# Altium footprint library General.PcbLib: 246 footprints (part 1 of 16)
Each footprint in its own frame and in the unit in brackets; x right, y up, seen from the top. Pads: shape width x height; smd on the part's side, far side on the other; paste and mask are expansions set on the pad; w line width, h text height; cw(c..) or ccw(c..) is an arc to the next point about the centre after c.
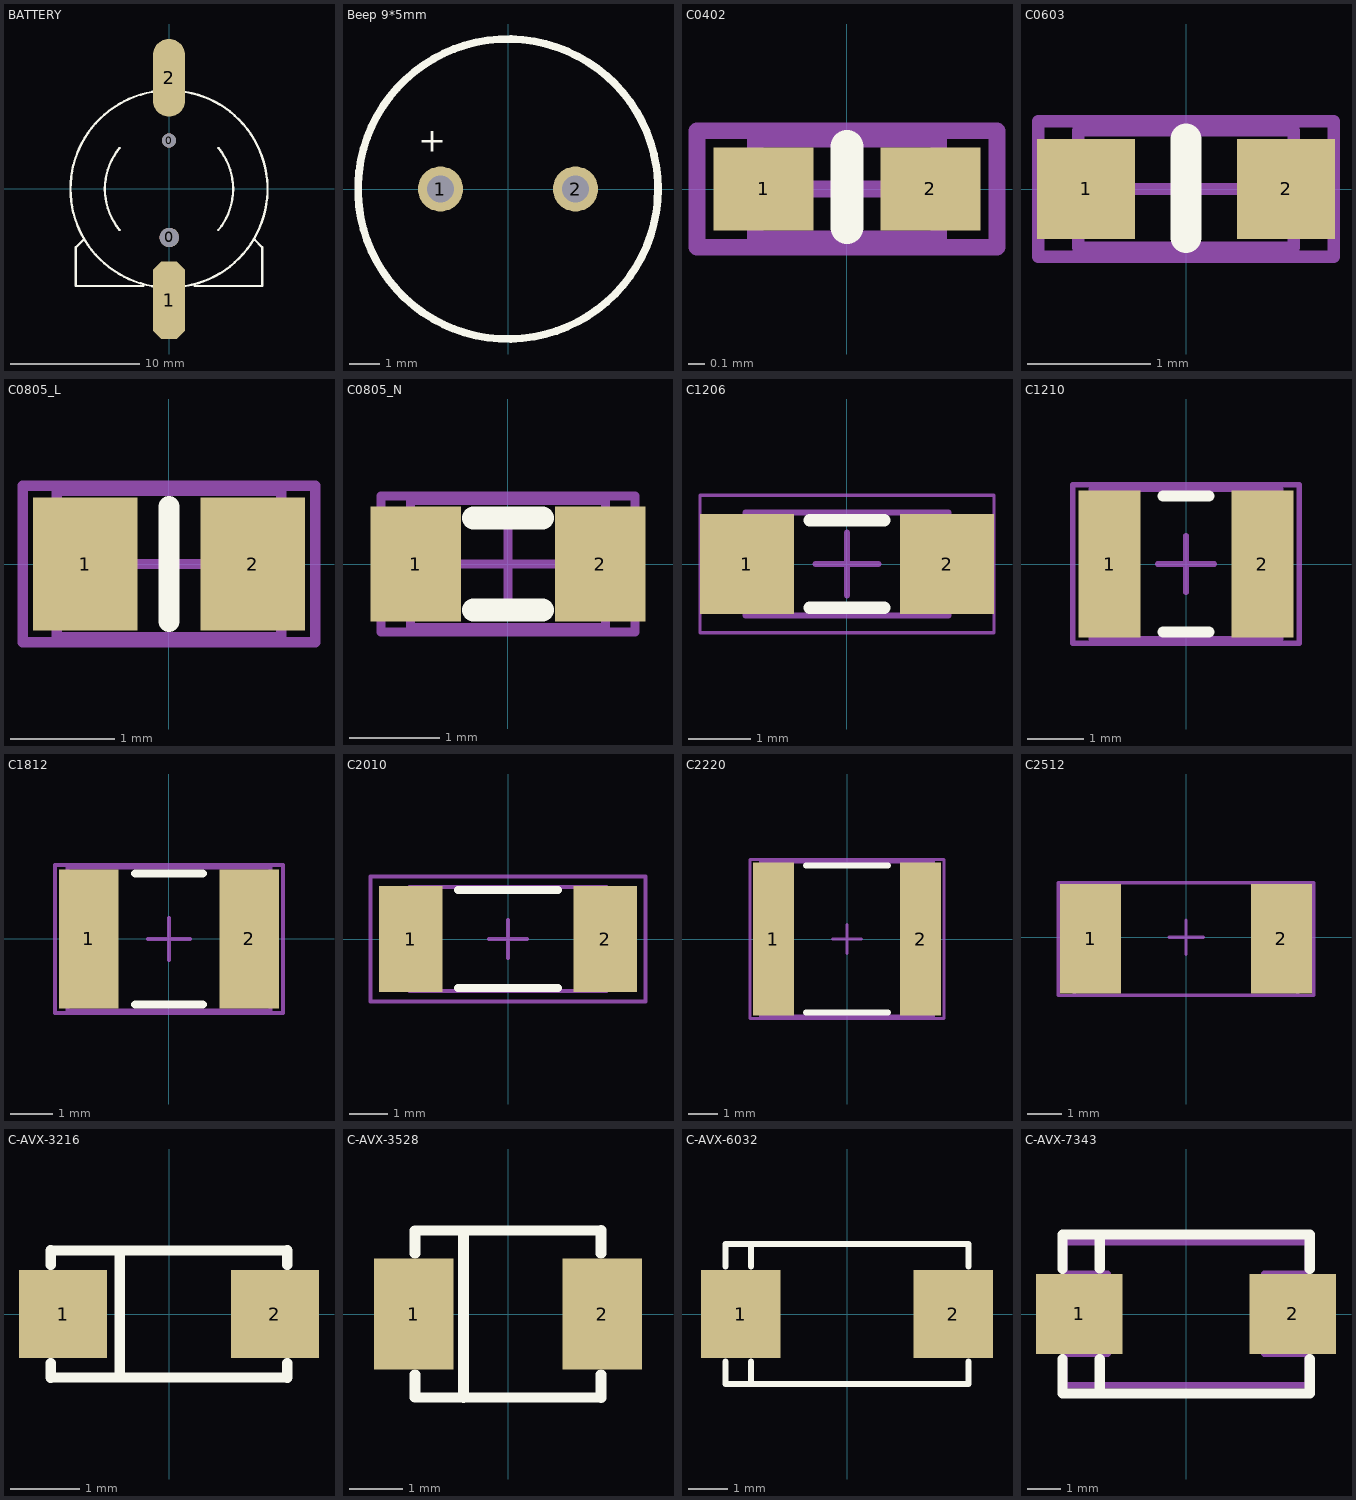
[diagram p0: the footprints below, top view; thin cyan lines are the x and y axes]

## BATTERY [mm]
pads (4):
  round 1.1 hole 1.1 unplated: 0(0,3.748)
  round 1.5 hole 1.5 unplated: 0(0.025,-3.752)
  oct 2.5x6 smd: 1(0,-8.602)
  oval 2.5x6 smd: 2(0,8.598)
Top Overlay:
  lines w0.178: -6.6,-3.902 -7.2,-4.502 -7.2,-7.502 -2,-7.502 ; -3.815,-3.171 cw(c0,-0.002) -3.812,3.171 ; -0.833,-7.576 cw(c0,-0.002) -7.62,-0.002 cw(c0,-0.002) -0.833,7.573 ; 0.833,-7.576 ccw(c0,-0.002) 0.833,7.573 ; 2,-7.502 7.2,-7.502 7.2,-4.502 6.625,-3.927 ; 3.81,-3.177 ccw(c0,-0.002) 3.812,3.171
3D body "User Library-cr1220.STEP": height 4.44, standoff -0.5, extent -7.504,-9.102 7.493,9.398

## Beep 9*5mm [mm] "蜂鸣器9mm*5mm"
height 5
pads (2):
  round 1.5 hole 0.9: 1(-2.25,0) 2(2.25,0)
Top Overlay:
  lines w0.254: 4.985,0.384 cw(c0,0) 4.985,0.387
  text "+" at -3,1.25 h0.81
3D body "User Library-HCM1005.step": height 5.6, standoff -3.9, extent -5,-5 5,5

## C0402 [mm] "Chip Capacitor, Body 1.0x0.5mm, IPC High Density"
height 1.3
pads (2):
  rect 0.6x0.5 smd: 1(-0.5,0) 2(0.5,0)
Top Overlay:
  lines w0.2: 0,-0.229 0,0.254
Mechanical 13:
  lines w0.1: -0.55,-0.3 0.55,-0.3 0.55,0.3 -0.55,0.3 -0.55,-0.3
Mechanical 15:
  lines w0.1: -0.3,0 0.3,0 ; 0,-0.3 0,0.3 ; -0.9,-0.35 0.9,-0.35 0.9,0.35 -0.9,0.35 -0.9,-0.35
3D body "CAPC1005X56N EIA 0402.step": height 0.56, standoff 0, extent -0.5,-0.25 0.5,0.25

## C0603 [mil] "Chip Capacitor, Body 1.6x0.8mm, IPC High Density"
height 36
pads (2):
  rect 31.5x32 smd: 1(-32,0) 2(32,0)
Top Overlay:
  lines w10: 0,-15.5 0,16
Mechanical 13:
  lines w3.94: -34.45,-18.7 -34.45,18.7 34.45,18.7 34.45,-18.7 -34.45,-18.7
Mechanical 15:
  lines w3.94: -18.7,0 18.7,0 ; 0,-18.7 0,18.7 ; -47.24,-21.65 -47.24,21.65 47.24,21.65 47.24,-21.65 -47.24,-21.65
3D body "User Library-Chip Capacitor0603.step": height 33.86, standoff 0, extent -31.49,-15.74 31.5,15.75

## C0805_L [mm] "Chip Capacitor, Body 2.0x1.2mm, IPC High Density"
height 0.7
pads (2):
  rect 1x1.27 smd: 1(-0.8,0) 2(0.8,0)
Top Overlay:
  lines w0.2: 0,-0.55 0,0.55
Mechanical 13:
  lines w0.1: -1.075,-0.7 1.075,-0.7 1.075,0.7 -1.075,0.7 -1.075,-0.7
Mechanical 15:
  lines w0.1: -0.5,0 0.5,0 ; 0,-0.5 0,0.5 ; -1.4,-0.75 1.4,-0.75 1.4,0.75 -1.4,0.75 -1.4,-0.75
3D body "CAPC2012X70N EIA 0805.step": height 0.7, standoff 0, extent -1,-0.6 1,0.6

## C0805_N [mm] "Chip Capacitor, Body 2.0x1.2mm, IPC Medium Density"
height 0.7
pads (2):
  rect 1x1.27 smd: 1(-1.016,0) 2(1.016,0)
Top Overlay:
  lines w0.254: -0.381,-0.508 0.381,-0.508 ; -0.381,0.508 0.381,0.508
Mechanical 13:
  lines w0.1: -1.075,-0.7 -1.075,0.7 1.075,0.7 1.075,-0.7 -1.075,-0.7
Mechanical 15:
  lines w0.1: -0.5,0 0.5,0 ; 0,-0.5 0,0.5 ; -1.4,-0.75 -1.4,0.75 1.4,0.75 1.4,-0.75 -1.4,-0.75
3D body "CAPC2012X70N EIA 0805.step": height 0.7, standoff 0, extent -1,-0.6 1,0.6

## C1206 [mm] "Chip Capacitor, 2-Leads, Body 3.20x1.60mm, IPC Medium Density"
height 0.6
pads (2):
  rect 1.5x1.6 smd: 1(-1.6,0) 2(1.6,0)
Top Overlay:
  lines w0.2: -0.6,-0.7 0.6,-0.7 ; -0.6,0.7 0.6,0.7
Mechanical 13:
  lines w0.1: -1.625,-0.825 -1.625,0.825 1.625,0.825 1.625,-0.825 -1.625,-0.825
Mechanical 15:
  lines w0.05: -2.35,-1.1 -2.35,1.1 2.35,1.1 2.35,-1.1 -2.35,-1.1
  lines w0.1: -0.5,0 0.5,0 ; 0,-0.5 0,0.5
3D body "CAPC3216X125N EIA 1206.step": height 1.25, standoff 0, extent -1.6,-0.8 1.6,0.8

## C1210 [mm] "Chip Capacitor, Body 3.2x2.5mm, IPC High Density"
height 0.9
pads (2):
  rect 1.1x2.6 smd: 1(-1.35,0) 2(1.35,0)
Top Overlay:
  lines w0.2: -0.4,-1.2 0.4,-1.2 ; -0.4,1.2 0.4,1.2
Mechanical 13:
  lines w0.1: -1.675,-1.32 1.675,-1.32 1.675,1.32 -1.675,1.32 -1.675,-1.32
Mechanical 15:
  lines w0.1: -0.5,0 0.5,0 ; 0,-0.5 0,0.5 ; -2,-1.4 2,-1.4 2,1.4 -2,1.4 -2,-1.4
3D body "CAPC3225X120N EIA 1210.step": height 1.2, standoff 0, extent -1.6,-1.25 1.6,1.25

## C1812 [mm] "Chip Capacitor, Body 4.5x3.2mm, IPC High Density"
height 1.4
pads (2):
  rect 1.4x3.3 smd: 1(-1.9,0) 2(1.9,0)
Top Overlay:
  lines w0.2: -0.8,-1.55 0.8,-1.55 ; -0.8,1.55 0.8,1.55
Mechanical 13:
  lines w0.1: -2.4,-1.7 -2.4,1.7 2.4,1.7 2.4,-1.7 -2.4,-1.7
Mechanical 15:
  lines w0.1: -0.5,0 0.5,0 ; 0,-0.5 0,0.5 ; -2.7,-1.75 -2.7,1.75 2.7,1.75 2.7,-1.75 -2.7,-1.75
3D body "CAPC4532X200N EIA 1812.step": height 2, standoff 0, extent -2.25,-1.6 2.25,1.6

## C2010 [mm] "Chip Capacitor, Body 5.0x2.5mm, IPC High Density"
height 0.6
pads (2):
  rect 1.65x2.75 smd: 1(-2.525,0) 2(2.525,0)
Top Overlay:
  lines w0.2: -1.3,-1.275 1.3,-1.275 ; -1.3,1.275 1.3,1.275
Mechanical 13:
  lines w0.1: -2.565,-1.35 -2.565,1.35 2.565,1.35 2.565,-1.35 -2.565,-1.35
Mechanical 15:
  lines w0.1: -0.5,0 0.5,0 ; 0,-0.5 0,0.5 ; -3.575,-1.625 -3.575,1.625 3.575,1.625 3.575,-1.625 -3.575,-1.625
3D body "CAPC5025X71N EIA 2010.step": height 0.71, standoff 0, extent -2.5,-1.25 2.5,1.25

## C2220 [mm] "Chip Capacitor, Body 5.7x5.0mm, IPC High Density"
height 1.4
pads (2):
  rect 1.4x5.2 smd: 1(-2.5,0) 2(2.5,0)
Top Overlay:
  lines w0.2: -1.4,-2.5 1.4,-2.5 ; -1.4,2.5 1.4,2.5
Mechanical 13:
  lines w0.1: -2.95,-2.625 -2.95,2.625 2.95,2.625 2.95,-2.625 -2.95,-2.625
Mechanical 15:
  lines w0.1: -0.5,0 0.5,0 ; 0,-0.5 0,0.5 ; -3.3,-2.7 -3.3,2.7 3.3,2.7 3.3,-2.7 -3.3,-2.7
3D body "CAPC5750X230N EIA 2220.step": height 2.3, standoff 0, extent -2.85,-2.5 2.85,2.5

## C2512 [mm] "Chip Capacitor, Body 6.4x3.2mm, IPC High Density"
pads (2):
  rect 1.8x3.2 smd: 1(-2.8,-0.05) 2(2.8,-0.05)
Mechanical 13:
  lines w0.1: -3.275,-1.7 -3.275,1.6 3.275,1.6 3.275,-1.7 -3.275,-1.7
Mechanical 15:
  lines w0.1: -0.5,0 0.5,0 ; 0,-0.5 0,0.5 ; -3.746,-1.714 -3.746,1.587 3.746,1.587 3.746,-1.714 -3.746,-1.714
3D body "CAPC6332X71N EIA 2512.step": height 0.71, standoff 0, extent -3.15,-1.6 3.15,1.6

## C-AVX-3216 [mil] "钽电容3.2*1.6mm"
height 78.74
pads (2):
  rect 50x50 smd: 1(-60,0) 2(60,0)
Top Overlay:
  lines w5.91: -67,-36 67,-36 ; -67,36 67,36
  lines w6: -67,-36 -67,-28 ; -67,28 -67,36 ; -28,-35 -28,35 ; 67,-36 67,-28 ; 67,28 67,36
3D body "User Library-AVX_ACASE.step": height 67.32, standoff 0, extent -66.92,-33.06 66.94,33.08

## C-AVX-3528 [mm] "钽电容3.5*2.8mm"
height 3
pads (2):
  rect 1.5x2.1 smd: 1(-1.778,0) 2(1.778,0)
Top Overlay:
  lines w0.2: -1.753,-1.143 -1.753,-1.572 1.753,-1.578 1.753,-1.143 ; -1.753,1.143 -1.753,1.572 1.753,1.578 1.753,1.143 ; -0.838,-1.575 -0.838,1.549
3D body "User Library-AVX_BCASE.step": height 2.03, standoff 0, extent -1.85,-1.465 1.85,1.465

## C-AVX-6032 [mm] "钽电容6*3.2mm"
pads (2):
  rect 2x2.2 smd: 1(-2.667,0) 2(2.667,0)
Top Overlay:
  lines w0.152: -3.048,-1.194 -3.048,-1.753 3.048,-1.753 3.048,-1.194 ; -3.048,1.194 -3.048,1.753 3.048,1.753 3.048,1.194 ; -2.413,-1.676 -2.413,-1.194 ; -2.413,1.194 -2.413,1.753
3D body "User Library-AVX_C_CASE.step": height 2.7, standoff 0, extent -3.05,-1.675 3.05,1.675

## C-AVX-7343 [mm] "钽电容7.3*4.3mm 低密度"
height 4
pads (2):
  rect 2.6x2.4 smd: 1(-3.202,0.007) 2(3.198,0.007)
Top Overlay:
  lines w0.305: -3.708,-1.346 -3.708,-2.388 3.708,-2.388 3.708,-1.346 ; -3.708,1.346 -3.708,2.388 3.708,2.388 3.708,1.346 ; -2.591,-2.388 -2.591,-1.346 ; -2.591,1.36 -2.591,2.337
Mechanical 15:
  lines w0.2: -3.651,-1.192 -2.351,-1.192 -2.351,1.208 -3.651,1.208 ; 3.649,-1.192 2.349,-1.192 2.349,1.208 3.649,1.208 ; -3.651,-2.142 -3.651,2.158 3.649,2.158 3.649,-2.142 -3.651,-2.142
3D body "User Library-AVX_D_CASE.step": height 3.01, standoff 0, extent -3.7,-2.225 3.7,2.225